# Altium footprint library Electronic Devices_LIB.PcbLib: 410 footprints (part 2 of 26)
Each footprint in its own frame and in the unit in brackets; x right, y up, seen from the top. Pads: shape width x height; smd on the part's side, far side on the other; paste and mask are expansions set on the pad; w line width, h text height; cw(c..) or ccw(c..) is an arc to the next point about the centre after c.
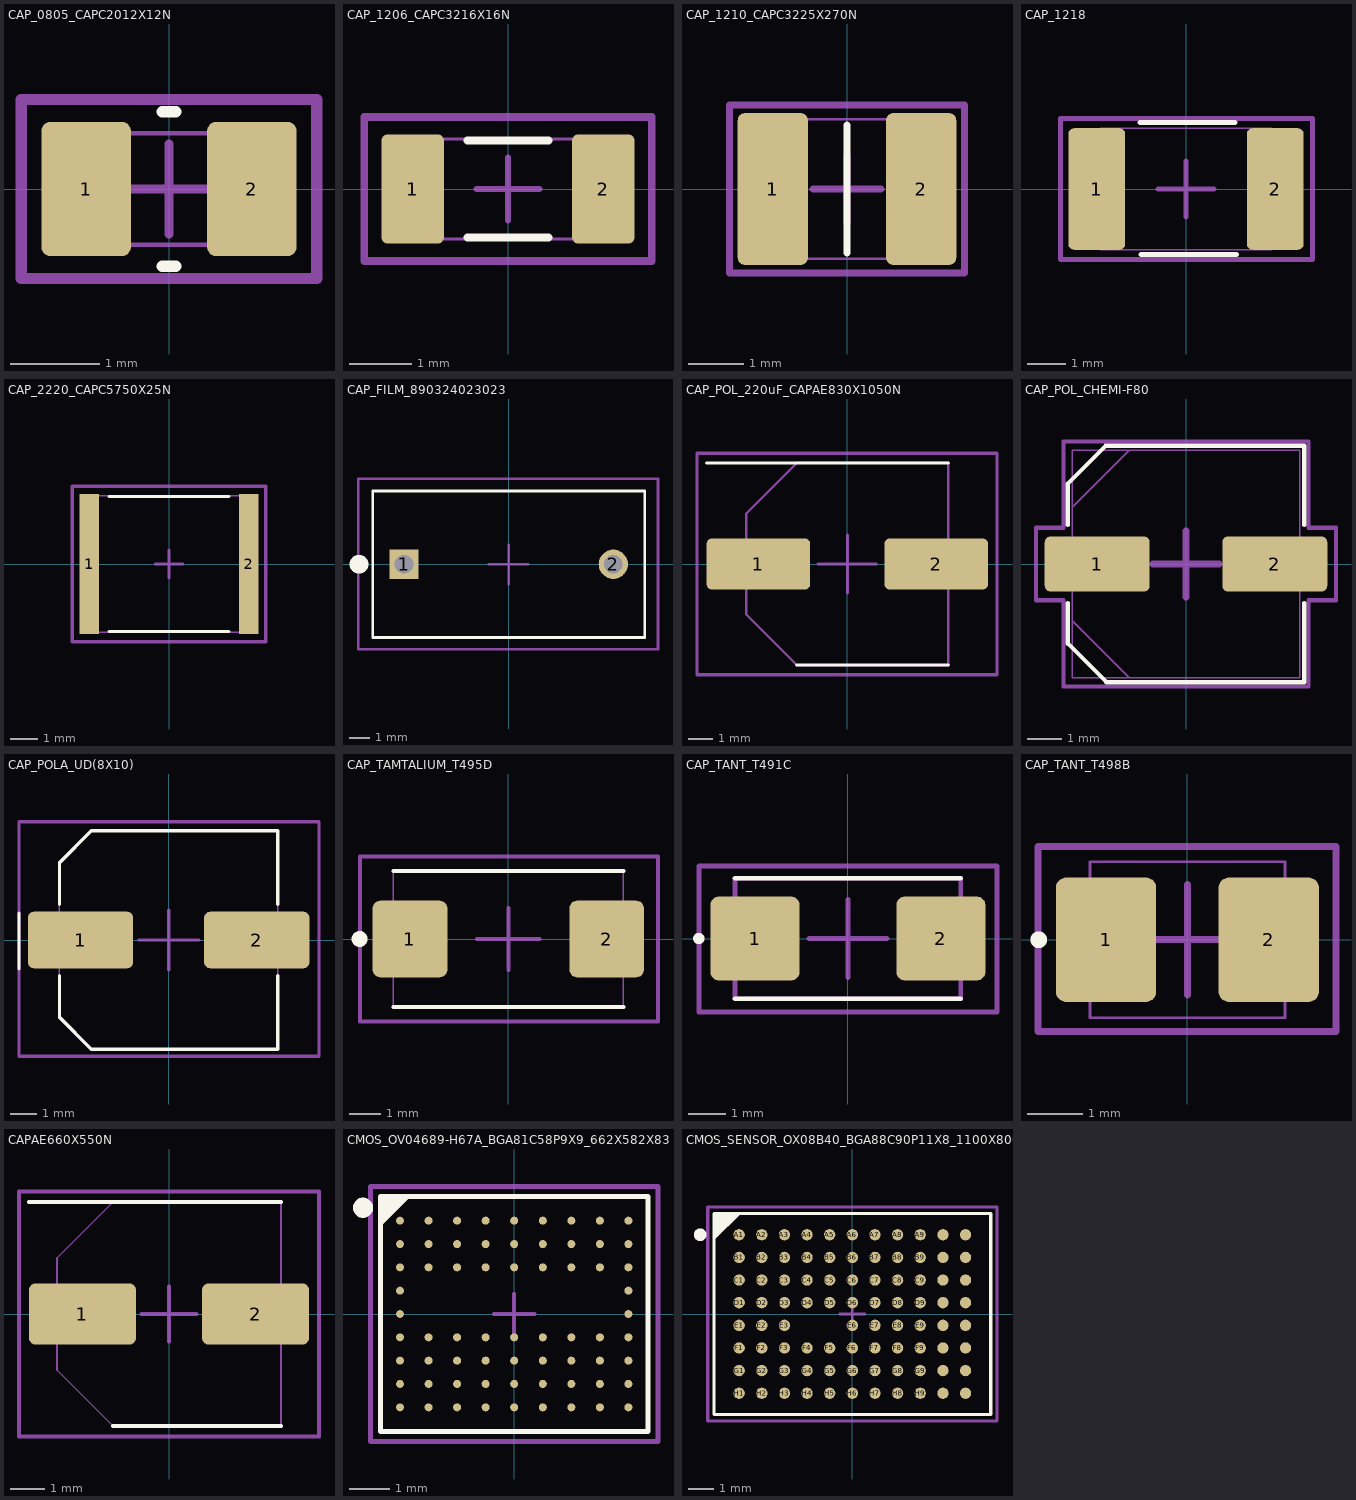
[diagram p1: the footprints below, top view; thin cyan lines are the x and y axes]

## CAP_0805_CAPC2012X12N [mm] "Chip Capacitor, 2-Leads, Body 2.00x1.25mm, IPC Medium Density"
height 1.25
pads (2):
  rrect20% 1x1.5 smd: 1(-0.925,0) 2(0.925,0)
Top Overlay:
  lines w0.127: -0.076,-0.864 0.076,-0.864 ; -0.076,0.864 0.076,0.864
Top Assembly:
  lines w0.051: -1,-0.625 1,-0.625 1,0.625 -1,0.625 -1,-0.625
  text ".Designator" at -2.54,-0.136 h0.51
Top Courtyard:
  lines w0.1: -0.5,0 0.5,0 ; 0,-0.5 0,0.5
  lines w0.127: -1.65,-1 -1.65,1 1.65,1 1.65,-1 -1.65,-1
3D body "CAP0805.stp": height 0.78, standoff 0, extent -1,-0.625 1,0.625

## CAP_1206_CAPC3216X16N [mm] "Chip Capacitor, 2-Leads, Body 3.20x1.60mm, IPC Medium Density"
height 1.6
pads (2):
  rrect20% 1x1.75 smd: 1(-1.525,0) 2(1.525,0)
Top Overlay:
  lines w0.127: -0.65,-0.775 0.65,-0.775 ; -0.65,0.775 0.65,0.775
Top Assembly:
  lines w0.051: -1.6,-0.8 1.6,-0.8 1.6,0.8 -1.6,0.8 -1.6,-0.8
  text ".Designator" at -2.616,-0.161 h0.51
Top Courtyard:
  lines w0.1: -0.5,0 0.5,0 ; 0,-0.5 0,0.5
  lines w0.127: -2.3,-1.15 2.3,-1.15 2.3,1.15 -2.3,1.15 -2.3,-1.15
3D body "CAP_1206_CAPC3216X16N.step": height 1.6, standoff 0, extent -1.6,-0.8 1.6,0.8

## CAP_1210_CAPC3225X270N [mm] "0.126\" L x 0.098\" W (3.20mm x 2.50mm)"
height 2.7
pads (2):
  rrect20% 1.26x2.72 smd: 1(-1.33,0) 2(1.33,0)
Top Overlay:
  lines w0.127: 0,-1.15 0,1.15
Top Assembly:
  lines w0.051: -1.6,-1.25 1.6,-1.25 1.6,1.25 -1.6,1.25 -1.6,-1.25
  text ".Designator" at -2.438,-0.136 h0.51
Top Courtyard:
  lines w0.127: -0.61,0 0,0 ; 0,-0.61 0,0 ; 0,0.61 0,0 ; 0.61,0 0,0 ; -2.11,-1.51 2.11,-1.51 2.11,1.51 -2.11,1.51 -2.11,-1.51
3D body "GRM32ER71E226KE15L.stp": height 2.7, standoff 0, extent -1.6,-1.25 1.6,1.25

## CAP_1218 [mm]
pads (2):
  rrect20% 1.5x3.2 smd: 1(-2.35,0) 2(2.35,0)
Top Overlay:
  lines w0.127: -1.219,1.753 1.295,1.753 ; -1.181,-1.727 1.333,-1.727
Top Assembly:
  lines w0.051: -2.25,-1.6 2.25,-1.6 2.25,1.6 -2.25,1.6 -2.25,-1.6
  text ".Designator" at -2.616,-0.186 h0.51
Top Courtyard:
  lines w0.127: -0.737,0 0,0 ; 0,-0.737 0,0 ; 0,0.737 0,0 ; 0.737,0 0,0 ; -3.302,-1.854 3.327,-1.854 3.327,1.854 -3.302,1.854 -3.302,-1.854
3D body "C4532X5R1C336M250KA.stp": height 3.2, standoff 0, extent -2.2,-1.6 2.3,1.6

## CAP_2220_CAPC5750X25N [mm] "Chip Capacitor, 2-Leads, Body 5.70x5.00mm, IPC Medium Density"
height 2.5
pads (2):
  rect 0.7x5.15 smd: 1(-2.925,0) 2(2.925,0)
Top Overlay:
  lines w0.127: -2.2,-2.475 2.2,-2.475 ; -2.2,2.475 2.2,2.475
Top Assembly:
  lines w0.051: -2.85,-2.5 -2.85,2.5 2.85,2.5 2.85,-2.5 -2.85,-2.5
  text ".Designator" at -2.413,-0.085 h0.51
Top Courtyard:
  lines w0.1: -0.5,0 0.5,0 ; 0,-0.5 0,0.5
  lines w0.127: -3.55,-2.85 -3.55,2.85 3.55,2.85 3.55,-2.85 -3.55,-2.85
3D body "CAP_2220_CAPC5750X25N.step": height 2.5, standoff 0, extent -2.85,-2.5 2.85,2.5

## CAP_FILM_890324023023 [mm]
pads (2):
  rect 1.4x1.4 hole 0.9: 1(-5,0)
  round 1.4 hole 0.9: 2(5,0)
Top Overlay:
  lines w0.127: -6.5,-3.5 6.5,-3.5 6.5,3.5 -6.5,3.5 -6.5,-3.5
  lines w0.8: -7.202,0 ccw(c-7.152,0) -7.102,0 ccw(c-7.152,0) -7.202,0
Top Assembly:
  lines w0.051: -6.5,-3.5 6.5,-3.5 6.5,3.5 -6.5,3.5 -6.5,-3.5
  text ".Designator" at -2.866,-0.186 h0.51
Top Courtyard:
  lines w0.127: -0.94,0 0,0 ; 0,-0.94 0,0 ; 0,0.94 0,0 ; 0.94,0 0,0 ; -7.188,-4.064 7.137,-4.064 7.137,4.089 -7.188,4.089 -7.188,-4.064
3D body "Download_STP_89032402302xxx_rev1.stp": height 13.05, standoff -3.95, extent -6.5,-3.5 6.5,3.5

## CAP_POL_220uF_CAPAE830X1050N [mm]
pads (2):
  rrect20% 4.25x2.1 smd: 1(-3.65,0) 2(3.65,0)
Top Overlay:
  lines w0.127: -5.775,4.15 4.15,4.15 ; -2.075,-4.15 4.15,-4.15
Top Assembly:
  lines w0.1: -4.15,-2.075 -2.075,-4.15 4.15,-4.15 4.15,4.15 -2.075,4.15 -4.15,2.075 -4.15,-2.075
  text ".Designator" at -2.311,-0.085 h0.51
Top Courtyard:
  lines w0.127: -1.194,0 0,0 ; 0,-1.194 0,0 ; 0,1.194 0,0 ; 1.194,0 0,0 ; -6.172,-4.547 6.147,-4.547 6.147,4.547 -6.172,4.547 -6.172,-4.547
3D body "EEV227M025A9MAA.stp": height 10.51, standoff 0, extent -5.25,-4.25 5.25,4.25

## CAP_POL_CHEMI-F80 [mil]
pads (2):
  rrect20% 120x63 smd: 1(-101.5,0) 2(101.5,0)
Top Overlay:
  lines w5: -135,-44.6 -135,-91 -91,-135 135,-135 135,-44.6 ; -135,44.6 -135,92 -92,135 135,135 135,44.6
Top Assembly:
  lines w2: -130,-65 -65,-130 ; -130,65 -65,130 ; -130,-130 130,-130 130,130 -130,130 -130,-130
  text ".Designator" at -94,-4.34 h20
Top Courtyard:
  lines w5: -171.5,-41.5 -171.5,41.5 -140,41.5 -140,140 140,140 140,41.5 171.5,41.5 171.5,-41.5 140,-41.5 140,-140 -140,-140 -140,-41.5 -171.5,-41.5
  lines w7.87: -38,0 0,0 ; 0,-38 0,0 ; 0,38 0,0 ; 38,0 0,0
3D body "CHEMI-F80.step": height 305.12, standoff 0, extent -141.5,-130 141.5,130

## CAP_POLA_UD(8X10) [mm] "UD(8X10)"
height 10.5
pads (2):
  rrect20% 4x2.15 smd: 1(-3.35,0) 2(3.35,0)
Top Overlay:
  lines w0.127: -5.69,-1.092 -5.69,1.016 ; -4.15,-1.35 -4.15,-2.937 -2.937,-4.15 4.15,-4.15 4.15,-1.35 ; -4.15,1.35 -4.15,2.937 -2.937,4.15 4.15,4.15 4.15,1.35
Top Assembly:
  lines w0.051: -4.15,-2.937 -4.074,-3.013 -3.802,-3.284 -3.259,-3.828 -2.937,-4.15 -2.769,-4.15 4.15,-4.15 4.15,4.15 -2.911,4.15 -4.15,2.911 -4.15,-2.937
  text ".Designator" at -2.692,-0.186 h0.51
Top Courtyard:
  lines w0.127: -1.143,0 0,0 ; 0,-1.143 0,0 ; 0,1.143 0,0 ; 1.143,0 0,0 ; -5.69,-4.42 -5.69,4.496 5.715,4.496 5.715,-4.42 -5.69,-4.42
3D body "U2-P_NCH.step": height 10.06, standoff 0, extent -4.445,-4.153 4.445,4.153

## CAP_TAMTALIUM_T495D [mm]
pads (2):
  rrect20% 2.37x2.43 smd: 1(-3.12,0) 2(3.12,0)
Top Overlay:
  circle w0.4: c-4.72,0 r0.05
  lines w0.127: -3.65,-2.15 3.65,-2.15 ; -3.65,2.15 3.65,2.15
Top Assembly:
  lines w0.051: -3.65,-2.15 3.65,-2.15 3.65,2.15 -3.65,2.15 -3.65,-2.15
  text ".Designator" at -2.54,-0.136 h0.51
Top Courtyard:
  lines w0.127: -0.991,0 0,0 ; 0,-0.991 0,0 ; 0,0.991 0,0 ; 0.991,0 0,0 ; -4.699,-2.616 -4.699,2.616 4.75,2.616 4.75,-2.616 -4.699,-2.616
3D body "T495D157K010ATE100.stp": height 3.11, standoff 0, extent -3.8,-2.3 3.8,2.3

## CAP_TANT_T491C [mm]
pads (2):
  rrect20% 2.37x2.23 smd: 1(-2.47,0) 2(2.47,0)
Top Overlay:
  circle w0.2: c-3.962,0 r0.05
  lines w0.127: -3,-1.6 3,-1.6 ; -3,1.6 3,1.6
Top Assembly:
  lines w0.127: -3,-1.6 -3,1.6 3,1.6 3,-1.6 -3,-1.6
  text ".Designator" at -2.667,-0.161 h0.51
Top Courtyard:
  lines w0.127: -1.041,0 0,0 ; 0,-1.041 0,0 ; 0,1.041 0,0 ; 1.041,0 0,0 ; -3.962,-1.956 3.962,-1.956 3.962,1.93 -3.962,1.93 -3.962,-1.956
3D body "T491C106K016AT7280.stp": height 2.81, standoff 0, extent -3.15,-1.75 3.15,1.75

## CAP_TANT_T498B [mm]
pads (2):
  rrect20% 1.8x2.23 smd: 1(-1.46,0) 2(1.46,0)
Top Overlay:
  circle w0.2: c-2.667,0 r0.05
Top Assembly:
  lines w0.051: -1.75,-1.4 1.75,-1.4 1.75,1.4 -1.75,1.4 -1.75,-1.4
  text ".Designator" at -2.311,-0.212 h0.51
Top Courtyard:
  lines w0.127: -0.991,0 0,0 ; 0,-0.991 0,0 ; 0,0.991 0,0 ; 0.991,0 0,0
Mechanical 15:
  lines w0.127: -2.677,-1.651 -2.677,1.676 2.667,1.676 2.667,-1.651 -2.677,-1.651
3D body "T498B106K006ATE2K1.stp": height 2.1, standoff 0, extent -1.85,-1.5 1.85,1.5

## CAPAE660X550N [mm] "0.260\" L x 0.260\" W (6.60mm x 6.60mm)"
height 5.5
pads (2):
  rrect20% 3.15x1.8 smd: 1(-2.55,0) 2(2.55,0)
Top Overlay:
  lines w0.127: -4.125,3.3 3.3,3.3 ; -1.65,-3.3 3.3,-3.3
Top Assembly:
  lines w0.051: -3.3,-1.65 -3.3,1.65 -1.65,3.3 3.3,3.3 3.3,-3.3 -1.65,-3.3 -3.3,-1.65
  text ".Designator" at -2.388,-0.085 h0.51
Top Courtyard:
  lines w0.127: -0.813,0 0,0 ; 0,-0.813 0,0 ; 0,0.813 0,0 ; 0.813,0 0,0 ; -4.42,-3.607 4.42,-3.607 4.42,3.607 -4.42,3.607 -4.42,-3.607
3D body "865080543009.stp": height 5.5, standoff 0, extent -3.4,-3.4 3.4,3.4

## CMOS_OV04689-H67A_BGA81C58P9X9_662X582X83 [mm] "BGA, 67-Leads, Body 6.63x5.82mmx0.83mm, Pitch V0.58mm X H0.71mm"
height 0.83
pads (67):
  round 0.2 smd: A1(-2.84,2.32) A2(-2.13,2.32) A3(-1.42,2.32) A4(-0.71,2.32) A5(0,2.32) A6(0.71,2.32) A7(1.42,2.32) A8(2.13,2.32) A9(2.84,2.32) B1(-2.84,1.74) B2(-2.13,1.74) B3(-1.42,1.74) B4(-0.71,1.74) B5(0,1.74) B6(0.71,1.74) B7(1.42,1.74) B8(2.13,1.74) B9(2.84,1.74) C1(-2.84,1.16) C2(-2.13,1.16) C3(-1.42,1.16) C4(-0.71,1.16) C5(0,1.16) C6(0.71,1.16) C7(1.42,1.16) C8(2.13,1.16) C9(2.84,1.16) D1(-2.84,0.58) D9(2.84,0.58) E1(-2.84,0) E9(2.84,0) F1(-2.84,-0.58) F2(-2.13,-0.58) F3(-1.42,-0.58) F4(-0.71,-0.58) F5(0,-0.58) F6(0.71,-0.58) F7(1.42,-0.58) F8(2.13,-0.58) F9(2.84,-0.58) G1(-2.84,-1.16) G2(-2.13,-1.16) G3(-1.42,-1.16) G4(-0.71,-1.16) G5(0,-1.16) G6(0.71,-1.16) G7(1.42,-1.16) G8(2.13,-1.16) G9(2.84,-1.16) H1(-2.84,-1.74) H2(-2.13,-1.74) H3(-1.42,-1.74) H4(-0.71,-1.74) H5(0,-1.74) H6(0.71,-1.74) H7(1.42,-1.74) H8(2.13,-1.74) H9(2.84,-1.74) J1(-2.84,-2.32) J2(-2.13,-2.32) J3(-1.42,-2.32) J4(-0.71,-2.32) J5(0,-2.32) J6(0.71,-2.32) J7(1.42,-2.32) J8(2.13,-2.32) J9(2.84,-2.32)
Top Overlay:
  circle w0.25: c-3.759,2.642 r0.125
  region: -2.655,2.925 -3.325,2.255 -3.325,2.925
  lines w0.127: -3.275,2.305 -2.705,2.875 ; -3.325,-2.925 -3.325,2.925 3.325,2.925 3.325,-2.925 -3.325,-2.925
Top Assembly:
  lines w0.051: -3.315,-2.915 -3.315,2.915 3.315,2.915 3.315,-2.915 -3.315,-2.915
Top Courtyard:
  lines w0.1: -0.5,0 0.5,0 ; 0,-0.5 0,0.5
  lines w0.127: -3.575,-3.175 -3.575,3.175 3.575,3.175 3.575,-3.175 -3.575,-3.175

## CMOS_SENSOR_OS08C10 [mm]

## CMOS_SENSOR_OX08B40_BGA88C90P11X8_1100X800X137 [mm] "BGA, 88-Leads, Body 11.00x8.00mmx1.37mm, Pitch 0.90mm"
height 1.37
pads (86):
  round 0.45 smd: A1(-4.5,3.15) A2(-3.6,3.15) A3(-2.7,3.15) A4(-1.8,3.15) A5(-0.9,3.15) A6(0,3.15) A7(0.9,3.15) A8(1.8,3.15) A9(2.7,3.15) A10(3.6,3.15) A11(4.5,3.15) B1(-4.5,2.25) B2(-3.6,2.25) B3(-2.7,2.25) B4(-1.8,2.25) B5(-0.9,2.25) B6(0,2.25) B7(0.9,2.25) B8(1.8,2.25) B9(2.7,2.25) B10(3.6,2.25) B11(4.5,2.25) C1(-4.5,1.35) C2(-3.6,1.35) C3(-2.7,1.35) C4(-1.8,1.35) C5(-0.9,1.35) C6(0,1.35) C7(0.9,1.35) C8(1.8,1.35) C9(2.7,1.35) C10(3.6,1.35) C11(4.5,1.35) D1(-4.5,0.45) D2(-3.6,0.45) D3(-2.7,0.45) D4(-1.8,0.45) D5(-0.9,0.45) D6(0,0.45) D7(0.9,0.45) D8(1.8,0.45) D9(2.7,0.45) D10(3.6,0.45) D11(4.5,0.45) E1(-4.5,-0.45) E2(-3.6,-0.45) E3(-2.7,-0.45) E6(0,-0.45) E7(0.9,-0.45) E8(1.8,-0.45) E9(2.7,-0.45) E10(3.6,-0.45) E11(4.5,-0.45) F1(-4.5,-1.35) F2(-3.6,-1.35) F3(-2.7,-1.35) F4(-1.8,-1.35) F5(-0.9,-1.35) F6(0,-1.35) F7(0.9,-1.35) F8(1.8,-1.35) F9(2.7,-1.35) F10(3.6,-1.35) F11(4.5,-1.35) G1(-4.5,-2.25) G2(-3.6,-2.25) G3(-2.7,-2.25) G4(-1.8,-2.25) G5(-0.9,-2.25) G6(0,-2.25) G7(0.9,-2.25) G8(1.8,-2.25) G9(2.7,-2.25) G10(3.6,-2.25) G11(4.5,-2.25) H1(-4.5,-3.15) H2(-3.6,-3.15) H3(-2.7,-3.15) H4(-1.8,-3.15) H5(-0.9,-3.15) H6(0,-3.15) H7(0.9,-3.15) H8(1.8,-3.15) H9(2.7,-3.15) H10(3.6,-3.15) H11(4.5,-3.15)
Top Overlay:
  circle w0.25: c-6.05,3.15 r0.125
  region: -4.5,4 -5.5,3 -5.5,4
  lines w0.127: -5.5,3 -4.5,4 ; -5.5,-4 5.5,-4 5.5,4 -5.5,4 -5.5,-4
Top Assembly:
  lines w0.051: -5.5,-4 5.5,-4 5.5,4 -5.5,4 -5.5,-4
  text ".Designator" at -2.499,-0.03 h0.51
Top Courtyard:
  lines w0.1: -0.5,0 0.5,0 ; 0,-0.5 0,0.5
  lines w0.127: -5.75,-4.25 5.75,-4.25 5.75,4.25 -5.75,4.25 -5.75,-4.25
3D body "CMOS_SENSOR_OX08B40_BGA88C90P11X8_1100X800X137.step": height 1.37, standoff 0, extent -5.5,-4 5.5,4